# Altium footprint library PCB_Connector.PcbLib: 86 footprints (part 5 of 6)
Each footprint in its own frame and in the unit in brackets; x right, y up, seen from the top. Pads: shape width x height; smd on the part's side, far side on the other; paste and mask are expansions set on the pad; w line width, h text height; cw(c..) or ccw(c..) is an arc to the next point about the centre after c.
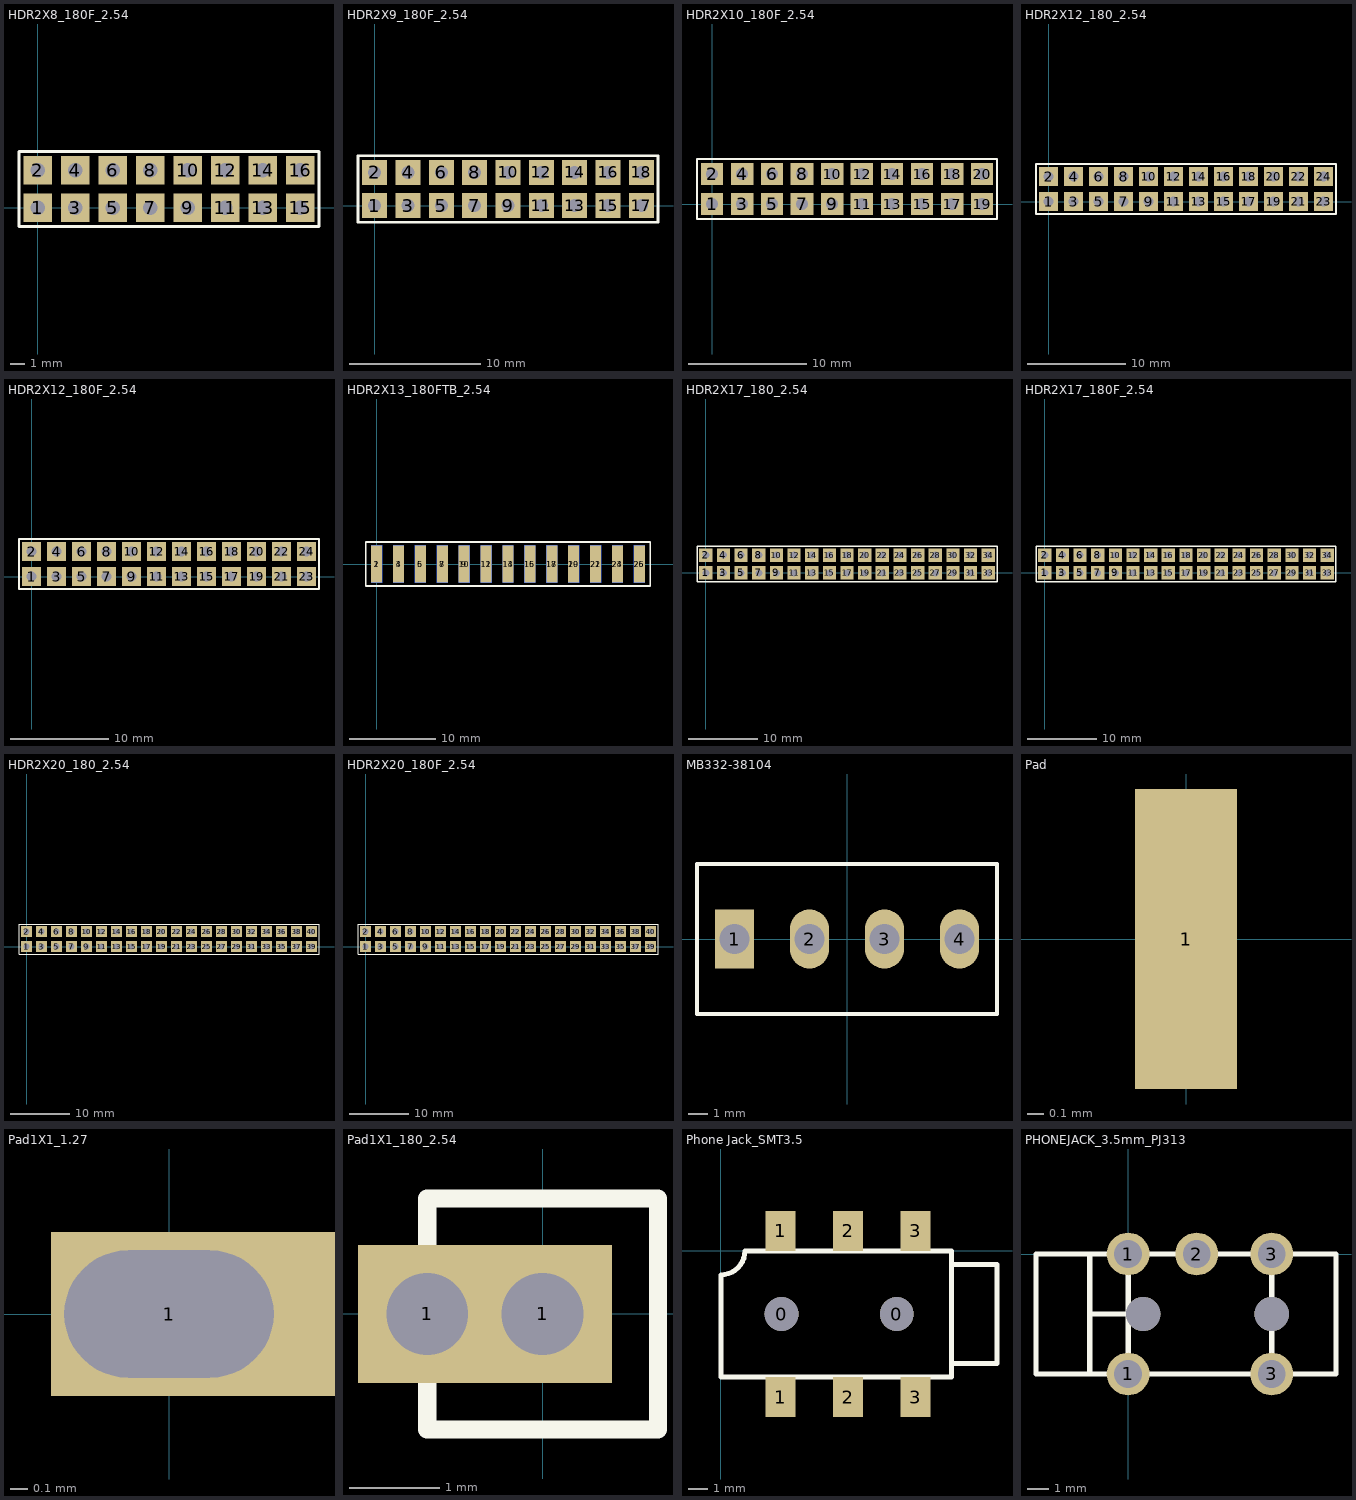
[diagram p4: the footprints below, top view; thin cyan lines are the x and y axes]

## HDR2X8_180F_2.54 [mm] "Connector; Header; 8x2 Position"
height 4.3
pads (16):
  rect 1.905x1.905 hole 1: 1(0,0) 2(0,2.54) 3(2.54,0) 4(2.54,2.54) 5(5.08,0) 6(5.08,2.54) 7(7.62,0) 8(7.62,2.54) 9(10.16,0) 10(10.16,2.54) 11(12.7,0) 12(12.7,2.54) 13(15.24,0) 14(15.24,2.54) 15(17.78,0) 16(17.78,2.54)
Top Overlay:
  lines w0.2: -1.27,-1.27 -1.27,3.81 19.05,3.81 19.05,-1.27 -1.27,-1.27
3D body: height 8.5, standoff -3.2, extent 13.845,-1.23 19.175,3.77
3D body: height 8.5, standoff -3.2, extent 6.225,-1.23 14.095,3.77
3D body: height 8.5, standoff -3.2, extent -1.395,-1.23 6.475,3.77

## HDR2X9_180F_2.54 [mm] "Connector; Header; 2x2 Position"
height 4.3
pads (18):
  rect 1.905x1.905 hole 1: 1(0,0) 2(0,2.54) 3(2.54,0) 4(2.54,2.54) 5(5.08,0) 6(5.08,2.54) 7(7.62,0) 8(7.62,2.54) 9(10.16,0) 10(10.16,2.54) 11(12.7,0) 12(12.7,2.54) 13(15.24,0) 14(15.24,2.54) 15(17.78,0) 16(17.78,2.54) 17(20.32,0) 18(20.32,2.54)
Top Overlay:
  lines w0.2: -1.27,-1.27 21.59,-1.27 21.59,3.81 -1.27,3.81 -1.27,-1.27
3D body: height 8.5, standoff -3.2, extent 13.845,-1.23 21.715,3.77
3D body: height 8.5, standoff -3.2, extent 6.225,-1.23 14.095,3.77
3D body: height 8.5, standoff -3.2, extent -1.395,-1.23 6.475,3.77

## HDR2X10_180F_2.54 [mm] "Connector; Header; 2x2 Position"
height 4.3
pads (20):
  rect 1.905x1.905 hole 1: 1(0,0) 2(0,2.54) 3(2.54,0) 4(2.54,2.54) 5(5.08,0) 6(5.08,2.54) 7(7.62,0) 8(7.62,2.54) 9(10.16,0) 10(10.16,2.54) 11(12.7,0) 12(12.7,2.54) 13(15.24,0) 14(15.24,2.54) 15(17.78,0) 16(17.78,2.54) 17(20.32,0) 18(20.32,2.54) 19(22.86,0) 20(22.86,2.54)
Top Overlay:
  lines w0.2: -1.27,-1.27 -1.27,3.81 24.13,3.81 24.13,-1.27 -1.27,-1.27
3D body: height 8.5, standoff -3.2, extent 11.305,-1.23 16.635,3.77
3D body: height 8.5, standoff -3.2, extent 16.385,-1.23 24.255,3.77
3D body: height 8.5, standoff -3.2, extent 3.685,-1.23 11.555,3.77
3D body: height 8.5, standoff -3.2, extent -1.395,-1.23 3.935,3.77

## HDR2X12_180_2.54 [mm]
height 4.3
pads (24):
  rect 1.905x1.905 hole 1: 1(0,0) 2(0,2.54) 3(2.54,0) 4(2.54,2.54) 5(5.08,0) 6(5.08,2.54) 7(7.62,0) 8(7.62,2.54) 9(10.16,0) 10(10.16,2.54) 11(12.7,0) 12(12.7,2.54) 13(15.24,0) 14(15.24,2.54) 15(17.78,0) 16(17.78,2.54) 17(20.32,0) 18(20.32,2.54) 19(22.86,0) 20(22.86,2.54) 21(25.4,0) 22(25.4,2.54) 23(27.94,0) 24(27.94,2.54)
Top Overlay:
  lines w0.2: -1.27,-1.27 -1.27,3.81 29.21,3.81 29.21,-1.27 -1.27,-1.27
3D body: height 7.58, standoff -2.94, extent -1.27,1.27 1.27,3.81
3D body: height 7.58, standoff -2.94, extent 1.27,1.27 3.81,3.81
3D body: height 7.58, standoff -2.94, extent 3.81,1.27 6.35,3.81
3D body: height 7.58, standoff -2.94, extent 6.35,1.27 8.89,3.81
3D body: height 7.58, standoff -2.94, extent 8.89,1.27 11.43,3.81
3D body: height 7.58, standoff -2.94, extent 11.43,1.27 13.97,3.81
3D body: height 7.58, standoff -2.94, extent 13.97,1.27 16.51,3.81
3D body: height 7.58, standoff -2.94, extent 16.51,1.27 19.05,3.81
3D body: height 7.58, standoff -2.94, extent 16.51,-1.27 19.05,1.27
3D body: height 7.58, standoff -2.94, extent 13.97,-1.27 16.51,1.27
3D body: height 7.58, standoff -2.94, extent 8.89,-1.27 11.43,1.27
3D body: height 7.58, standoff -2.94, extent 11.43,-1.27 13.97,1.27
3D body: height 7.58, standoff -2.94, extent 6.35,-1.27 8.89,1.27
3D body: height 7.58, standoff -2.94, extent 1.27,-1.27 3.81,1.27
3D body: height 7.58, standoff -2.94, extent 3.81,-1.27 6.35,1.27
3D body: height 7.58, standoff -2.94, extent -1.27,-1.27 1.27,1.27
3D body: height 7.58, standoff -2.94, extent 21.59,-1.27 24.13,1.27
3D body: height 7.58, standoff -2.94, extent 19.05,-1.27 21.59,1.27
3D body: height 7.58, standoff -2.94, extent 24.13,-1.27 26.67,1.27
3D body: height 7.58, standoff -2.94, extent 26.67,-1.27 29.21,1.27
3D body: height 7.58, standoff -2.94, extent 26.67,1.27 29.21,3.81
3D body: height 7.58, standoff -2.94, extent 24.13,1.27 26.67,3.81
3D body: height 7.58, standoff -2.94, extent 21.59,1.27 24.13,3.81
3D body: height 7.58, standoff -2.94, extent 19.05,1.27 21.59,3.81

## HDR2X12_180F_2.54 [mm]
height 4.3
pads (24):
  rect 1.905x1.905 hole 1: 1(0,0) 2(0,2.54) 3(2.54,0) 4(2.54,2.54) 5(5.08,0) 6(5.08,2.54) 7(7.62,0) 8(7.62,2.54) 9(10.16,0) 10(10.16,2.54) 11(12.7,0) 12(12.7,2.54) 13(15.24,0) 14(15.24,2.54) 15(17.78,0) 16(17.78,2.54) 17(20.32,0) 18(20.32,2.54) 19(22.86,0) 20(22.86,2.54) 21(25.4,0) 22(25.4,2.54) 23(27.94,0) 24(27.94,2.54)
Top Overlay:
  lines w0.2: -1.27,-1.27 -1.27,3.81 29.21,3.81 29.21,-1.27 -1.27,-1.27
3D body: height 8.5, standoff -3.2, extent 24.005,-1.23 29.335,3.77
3D body: height 8.5, standoff -3.2, extent 11.305,-1.23 16.635,3.77
3D body: height 8.5, standoff -3.2, extent 16.385,-1.23 24.255,3.77
3D body: height 8.5, standoff -3.2, extent 3.685,-1.23 11.555,3.77
3D body: height 8.5, standoff -3.2, extent -1.395,-1.23 3.935,3.77

## HDR2X13_180FTB_2.54 [mil] "Connector; Header; 2x2 Position"
height 169.29
pads (26):
  rect 50x170 smd: 1(0,0) 3(100,0) 5(200,0) 7(300,0) 9(400,0) 11(500,0) 13(600,0) 15(700,0) 17(800,0) 19(900,0) 21(1000,0) 23(1100,0) 25(1200,0)
  rect 50x170 smd far side: 2(0,0) 4(100,0) 6(200,0) 8(300,0) 10(400,0) 12(500,0) 14(600,0) 16(700,0) 18(800,0) 20(900,0) 22(1000,0) 24(1100,0) 26(1200,0)
Top Overlay:
  lines w7.87: -50,-100 1250,-100 1250,100 -50,100 -50,-100
Bottom Overlay:
  lines w7.87: -50,-100 -50,100 1250,100 1250,-100 -50,-100
3D body: height 98.43, standoff -98.43, extent -54.92,-44.98 254.92,415.65
3D body: height 98.43, standoff -98.43, extent 245.08,-44.98 454.93,415.65
3D body: height 98.43, standoff -98.43, extent 745.08,-44.98 954.93,415.65
3D body: height 98.43, standoff -98.43, extent 445.08,-44.98 754.92,415.65
3D body: height 98.43, standoff -98.43, extent 945.08,-44.98 1254.92,415.65

## HDR2X17_180_2.54 [mm] "Connector; Header; 8x2 Position"
height 4.3
pads (34):
  rect 1.905x1.905 hole 1: 1(0,0) 2(0,2.54) 3(2.54,0) 4(2.54,2.54) 5(5.08,0) 6(5.08,2.54) 7(7.62,0) 8(7.62,2.54) 9(10.16,0) 10(10.16,2.54) 11(12.7,0) 12(12.7,2.54) 13(15.24,0) 14(15.24,2.54) 15(17.78,0) 16(17.78,2.54) 17(20.32,0) 18(20.32,2.54) 19(22.86,0) 20(22.86,2.54) 21(25.4,0) 22(25.4,2.54) 23(27.94,0) 24(27.94,2.54) 25(30.48,0) 26(30.48,2.54) 27(33.02,0) 28(33.02,2.54) 29(35.56,0) 30(35.56,2.54) 31(38.1,0) 32(38.1,2.54) 33(40.64,0) 34(40.64,2.54)
Top Overlay:
  lines w0.2: -1.27,-1.27 41.9,-1.27 41.9,3.81 -1.27,3.81 -1.27,-1.27
3D body: height 7.58, standoff -2.94, extent -1.27,1.27 1.27,3.81
3D body: height 7.58, standoff -2.94, extent 1.27,1.27 3.81,3.81
3D body: height 7.58, standoff -2.94, extent 3.81,1.27 6.35,3.81
3D body: height 7.58, standoff -2.94, extent 6.35,1.27 8.89,3.81
3D body: height 7.58, standoff -2.94, extent 8.89,1.27 11.43,3.81
3D body: height 7.58, standoff -2.94, extent 11.43,1.27 13.97,3.81
3D body: height 7.58, standoff -2.94, extent 13.97,1.27 16.51,3.81
3D body: height 7.58, standoff -2.94, extent 16.51,1.27 19.05,3.81
3D body: height 7.58, standoff -2.94, extent 19.05,1.27 21.59,3.81
3D body: height 7.58, standoff -2.94, extent 21.59,1.27 24.13,3.81
3D body: height 7.58, standoff -2.94, extent 24.13,1.27 26.67,3.81
3D body: height 7.58, standoff -2.94, extent 29.21,1.27 31.75,3.81
3D body: height 7.58, standoff -2.94, extent 26.67,1.27 29.21,3.81
3D body: height 7.58, standoff -2.94, extent 31.75,1.27 34.29,3.81
3D body: height 7.58, standoff -2.94, extent 34.29,1.27 36.83,3.81
3D body: height 7.58, standoff -2.94, extent 36.83,1.27 39.37,3.81
3D body: height 7.58, standoff -2.94, extent 39.37,1.27 41.91,3.81
3D body: height 7.58, standoff -2.94, extent -1.27,-1.27 1.27,1.27
3D body: height 7.58, standoff -2.94, extent 1.27,-1.27 3.81,1.27
3D body: height 7.58, standoff -2.94, extent 3.81,-1.27 6.35,1.27
3D body: height 7.58, standoff -2.94, extent 6.35,-1.27 8.89,1.27
3D body: height 7.58, standoff -2.94, extent 8.89,-1.27 11.43,1.27
3D body: height 7.58, standoff -2.94, extent 11.43,-1.27 13.97,1.27
3D body: height 7.58, standoff -2.94, extent 13.97,-1.27 16.51,1.27
3D body: height 7.58, standoff -2.94, extent 16.51,-1.27 19.05,1.27
3D body: height 7.58, standoff -2.94, extent 19.05,-1.27 21.59,1.27
3D body: height 7.58, standoff -2.94, extent 21.59,-1.27 24.13,1.27
3D body: height 7.58, standoff -2.94, extent 24.13,-1.27 26.67,1.27
3D body: height 7.58, standoff -2.94, extent 29.21,-1.27 31.75,1.27
3D body: height 7.58, standoff -2.94, extent 26.67,-1.27 29.21,1.27
3D body: height 7.58, standoff -2.94, extent 31.75,-1.27 34.29,1.27
3D body: height 7.58, standoff -2.94, extent 34.29,-1.27 36.83,1.27
3D body: height 7.58, standoff -2.94, extent 36.83,-1.27 39.37,1.27
3D body: height 7.58, standoff -2.94, extent 39.37,-1.27 41.91,1.27

## HDR2X17_180F_2.54 [mm] "Connector; Header; 8x2 Position"
height 4.3
pads (34):
  rect 1.905x1.905 hole 1: 1(0,0) 2(0,2.54) 3(2.54,0) 4(2.54,2.54) 5(5.08,0) 6(5.08,2.54) 7(7.62,0) 8(7.62,2.54) 9(10.16,0) 10(10.16,2.54) 11(12.7,0) 12(12.7,2.54) 13(15.24,0) 14(15.24,2.54) 15(17.78,0) 16(17.78,2.54) 17(20.32,0) 18(20.32,2.54) 19(22.86,0) 20(22.86,2.54) 21(25.4,0) 22(25.4,2.54) 23(27.94,0) 24(27.94,2.54) 25(30.48,0) 26(30.48,2.54) 27(33.02,0) 28(33.02,2.54) 29(35.56,0) 30(35.56,2.54) 31(38.1,0) 32(38.1,2.54) 33(40.64,0) 34(40.64,2.54)
Top Overlay:
  lines w0.2: -1.27,-1.27 41.91,-1.27 41.91,3.81 -1.27,3.81 -1.27,-1.27
3D body: height 8.5, standoff -3.2, extent 24.005,-1.23 31.875,3.77
3D body: height 8.5, standoff -3.2, extent 31.625,-1.23 36.955,3.77
3D body: height 8.5, standoff -3.2, extent 11.305,-1.23 19.175,3.77
3D body: height 8.5, standoff -3.2, extent 18.925,-1.23 24.255,3.77
3D body: height 8.5, standoff -3.2, extent 6.225,-1.23 11.555,3.77
3D body: height 8.5, standoff -3.2, extent -1.395,-1.23 6.475,3.77
3D body: height 8.5, standoff -3.2, extent 36.705,-1.23 42.035,3.77

## HDR2X20_180_2.54 [mm] "Connector; Header; 8x2 Position"
height 4.3
pads (40):
  rect 1.905x1.905 hole 1: 1(0,0) 2(0,2.54) 3(2.54,0) 4(2.54,2.54) 5(5.08,0) 6(5.08,2.54) 7(7.62,0) 8(7.62,2.54) 9(10.16,0) 10(10.16,2.54) 11(12.7,0) 12(12.7,2.54) 13(15.24,0) 14(15.24,2.54) 15(17.78,0) 16(17.78,2.54) 17(20.32,0) 18(20.32,2.54) 19(22.86,0) 20(22.86,2.54) 21(25.4,0) 22(25.4,2.54) 23(27.94,0) 24(27.94,2.54) 25(30.48,0) 26(30.48,2.54) 27(33.02,0) 28(33.02,2.54) 29(35.56,0) 30(35.56,2.54) 31(38.1,0) 32(38.1,2.54) 33(40.64,0) 34(40.64,2.54) 35(43.18,0) 36(43.18,2.54) 37(45.72,0) 38(45.72,2.54) 39(48.26,0) 40(48.26,2.54)
Top Overlay:
  lines w0.2: -1.27,-1.27 49.53,-1.27 49.53,3.81 -1.27,3.81 -1.27,-1.27
3D body: height 7.58, standoff -2.94, extent 39.37,-1.27 41.91,1.27
3D body: height 7.58, standoff -2.94, extent 36.83,-1.27 39.37,1.27
3D body: height 7.58, standoff -2.94, extent 34.29,-1.27 36.83,1.27
3D body: height 7.58, standoff -2.94, extent 31.75,-1.27 34.29,1.27
3D body: height 7.58, standoff -2.94, extent 26.67,-1.27 29.21,1.27
3D body: height 7.58, standoff -2.94, extent 29.21,-1.27 31.75,1.27
3D body: height 7.58, standoff -2.94, extent 24.13,-1.27 26.67,1.27
3D body: height 7.58, standoff -2.94, extent 21.59,-1.27 24.13,1.27
3D body: height 7.58, standoff -2.94, extent 19.05,-1.27 21.59,1.27
3D body: height 7.58, standoff -2.94, extent 16.51,-1.27 19.05,1.27
3D body: height 7.58, standoff -2.94, extent 13.97,-1.27 16.51,1.27
3D body: height 7.58, standoff -2.94, extent 11.43,-1.27 13.97,1.27
3D body: height 7.58, standoff -2.94, extent 8.89,-1.27 11.43,1.27
3D body: height 7.58, standoff -2.94, extent 6.35,-1.27 8.89,1.27
3D body: height 7.58, standoff -2.94, extent 3.81,-1.27 6.35,1.27
3D body: height 7.58, standoff -2.94, extent 1.27,-1.27 3.81,1.27
3D body: height 7.58, standoff -2.94, extent -1.27,-1.27 1.27,1.27
3D body: height 7.58, standoff -2.94, extent 39.37,1.27 41.91,3.81
3D body: height 7.58, standoff -2.94, extent 36.83,1.27 39.37,3.81
3D body: height 7.58, standoff -2.94, extent 34.29,1.27 36.83,3.81
3D body: height 7.58, standoff -2.94, extent 31.75,1.27 34.29,3.81
3D body: height 7.58, standoff -2.94, extent 26.67,1.27 29.21,3.81
3D body: height 7.58, standoff -2.94, extent 29.21,1.27 31.75,3.81
3D body: height 7.58, standoff -2.94, extent 24.13,1.27 26.67,3.81
3D body: height 7.58, standoff -2.94, extent 21.59,1.27 24.13,3.81
3D body: height 7.58, standoff -2.94, extent 19.05,1.27 21.59,3.81
3D body: height 7.58, standoff -2.94, extent 16.51,1.27 19.05,3.81
3D body: height 7.58, standoff -2.94, extent 13.97,1.27 16.51,3.81
3D body: height 7.58, standoff -2.94, extent 11.43,1.27 13.97,3.81
3D body: height 7.58, standoff -2.94, extent 8.89,1.27 11.43,3.81
3D body: height 7.58, standoff -2.94, extent 6.35,1.27 8.89,3.81
3D body: height 7.58, standoff -2.94, extent 3.81,1.27 6.35,3.81
3D body: height 7.58, standoff -2.94, extent 1.27,1.27 3.81,3.81
3D body: height 7.58, standoff -2.94, extent -1.27,1.27 1.27,3.81
3D body: height 7.58, standoff -2.94, extent 41.91,1.27 44.45,3.81
3D body: height 7.58, standoff -2.94, extent 44.45,1.27 46.99,3.81
3D body: height 7.58, standoff -2.94, extent 46.99,1.27 49.53,3.81
3D body: height 7.58, standoff -2.94, extent 41.91,-1.27 44.45,1.27
3D body: height 7.58, standoff -2.94, extent 44.45,-1.27 46.99,1.27
3D body: height 7.58, standoff -2.94, extent 46.99,-1.27 49.53,1.27

## HDR2X20_180F_2.54 [mm] "Connector; Header; 8x2 Position"
height 4.3
pads (40):
  rect 1.905x1.905 hole 1: 1(0,0) 2(0,2.54) 3(2.54,0) 4(2.54,2.54) 5(5.08,0) 6(5.08,2.54) 7(7.62,0) 8(7.62,2.54) 9(10.16,0) 10(10.16,2.54) 11(12.7,0) 12(12.7,2.54) 13(15.24,0) 14(15.24,2.54) 15(17.78,0) 16(17.78,2.54) 17(20.32,0) 18(20.32,2.54) 19(22.86,0) 20(22.86,2.54) 21(25.4,0) 22(25.4,2.54) 23(27.94,0) 24(27.94,2.54) 25(30.48,0) 26(30.48,2.54) 27(33.02,0) 28(33.02,2.54) 29(35.56,0) 30(35.56,2.54) 31(38.1,0) 32(38.1,2.54) 33(40.64,0) 34(40.64,2.54) 35(43.18,0) 36(43.18,2.54) 37(45.72,0) 38(45.72,2.54) 39(48.26,0) 40(48.26,2.54)
Top Overlay:
  lines w0.2: -1.27,-1.27 49.53,-1.27 49.53,3.81 -1.27,3.81 -1.27,-1.27
3D body: height 8.5, standoff -3.2, extent 36.705,-1.23 44.575,3.77
3D body: height 8.5, standoff -3.2, extent 44.325,-1.23 49.655,3.77
3D body: height 8.5, standoff -3.2, extent 24.005,-1.23 31.875,3.77
3D body: height 8.5, standoff -3.2, extent 31.625,-1.23 36.955,3.77
3D body: height 8.5, standoff -3.2, extent 11.305,-1.23 19.175,3.77
3D body: height 8.5, standoff -3.2, extent 18.925,-1.23 24.255,3.77
3D body: height 8.5, standoff -3.2, extent 6.225,-1.23 11.555,3.77
3D body: height 8.5, standoff -3.2, extent -1.395,-1.23 6.475,3.77

## MB332-38104 [mm]
pads (4):
  rect 2x3 hole 1.5: 1(-5.715,0)
  oval 2x3 hole 1.5: 2(-1.905,0) 3(1.905,0) 4(5.715,0)
Top Overlay:
  lines w0.2: -7.62,-3.81 7.62,-3.81 7.62,3.81 -7.62,3.81 -7.62,-3.81
3D body: height 8.5, standoff -1.9, extent -8.686,-3.722 7.327,3.505

## Pad [mm]
pads (1):
  rect 0.61x1.8 smd: 1(0,0)

## Pad1X1_1.27 [mil] "Connector; Header; 2 Position"
height 169.29
pads (1):
  rect 66x36 hole 28 slot 46 at 0 deg copper offset 7,0: 1(0,0)

## Pad1X1_180_2.54 [mil] "Connector; Header; 2 Position"
height 169.29
pads (2):
  rect 60x60 hole 35.43: 1(-50,0) 1(0,0)
Top Overlay:
  lines w7.87: -50,-50 50,-50 50,50 -50,50 -50,-50

## Phone Jack_SMT3.5 [mm]
pads (8):
  round 1.7 hole 1.7: 0(3.05,-3.18) 0(8.85,-3.18)
  rect 1.5x2 smd: 1(3,-7.36) 1(3,1) 2(6.4,-7.36) 2(6.4,1) 3(9.8,-7.36) 3(9.8,1)
Top Overlay:
  lines w0.254: 11.6,-5.68 13.9,-5.68 13.9,-0.68 11.6,-0.68 ; 0,-6.36 11.6,-6.36 11.6,0 1.207,0 cw(c0,0) 0,-1.207 0,-6.36
3D body: height 4.95, standoff -0.7, extent -0.346,-7.595 13.554,1.355

## PHONEJACK_3.5mm_PJ313 [mm] "PJ313 3.5mm PhoneJack"
pads (7):
  round 2 hole 1.3: 1(0,-5.6) 1(0,0) 2(3.2,0) 3(6.7,-5.6) 3(6.7,0)
  round 1.6 hole 1.6: ""(0.7,-2.8) ""(6.7,-2.8)
Top Overlay:
  lines w0.254: 0.7,-2.8 -1.8,-2.8 ; -1.8,-5.6 -4.3,-5.6 -4.3,-2.8 -4.3,0 -1.8,0 ; -1.8,-5.6 -1.8,-2.8 ; -1.8,-5.6 0,-5.6 ; -1.8,-5.6 9.7,-5.6 9.7,-2.8 9.7,0 -1.8,0 ; -1.8,-2.8 -1.8,0 ; -1.8,0 0,0 ; 0,-5.6 6.7,-5.6 6.7,-2.8 6.7,0 3.2,0 0,0 ; 0,-5.6 0,0
3D body: height 5, standoff 0, extent -1.803,-5.613 9.703,0
3D body: height 5, standoff 0, extent -4.318,-5.325 -1.818,-0.345